# Altium footprint library Chestin_PcbLib.PcbLib: 203 footprints (part 13 of 13)
Each footprint in its own frame and in the unit in brackets; x right, y up, seen from the top. Pads: shape width x height; smd on the part's side, far side on the other; paste and mask are expansions set on the pad; w line width, h text height; cw(c..) or ccw(c..) is an arc to the next point about the centre after c.
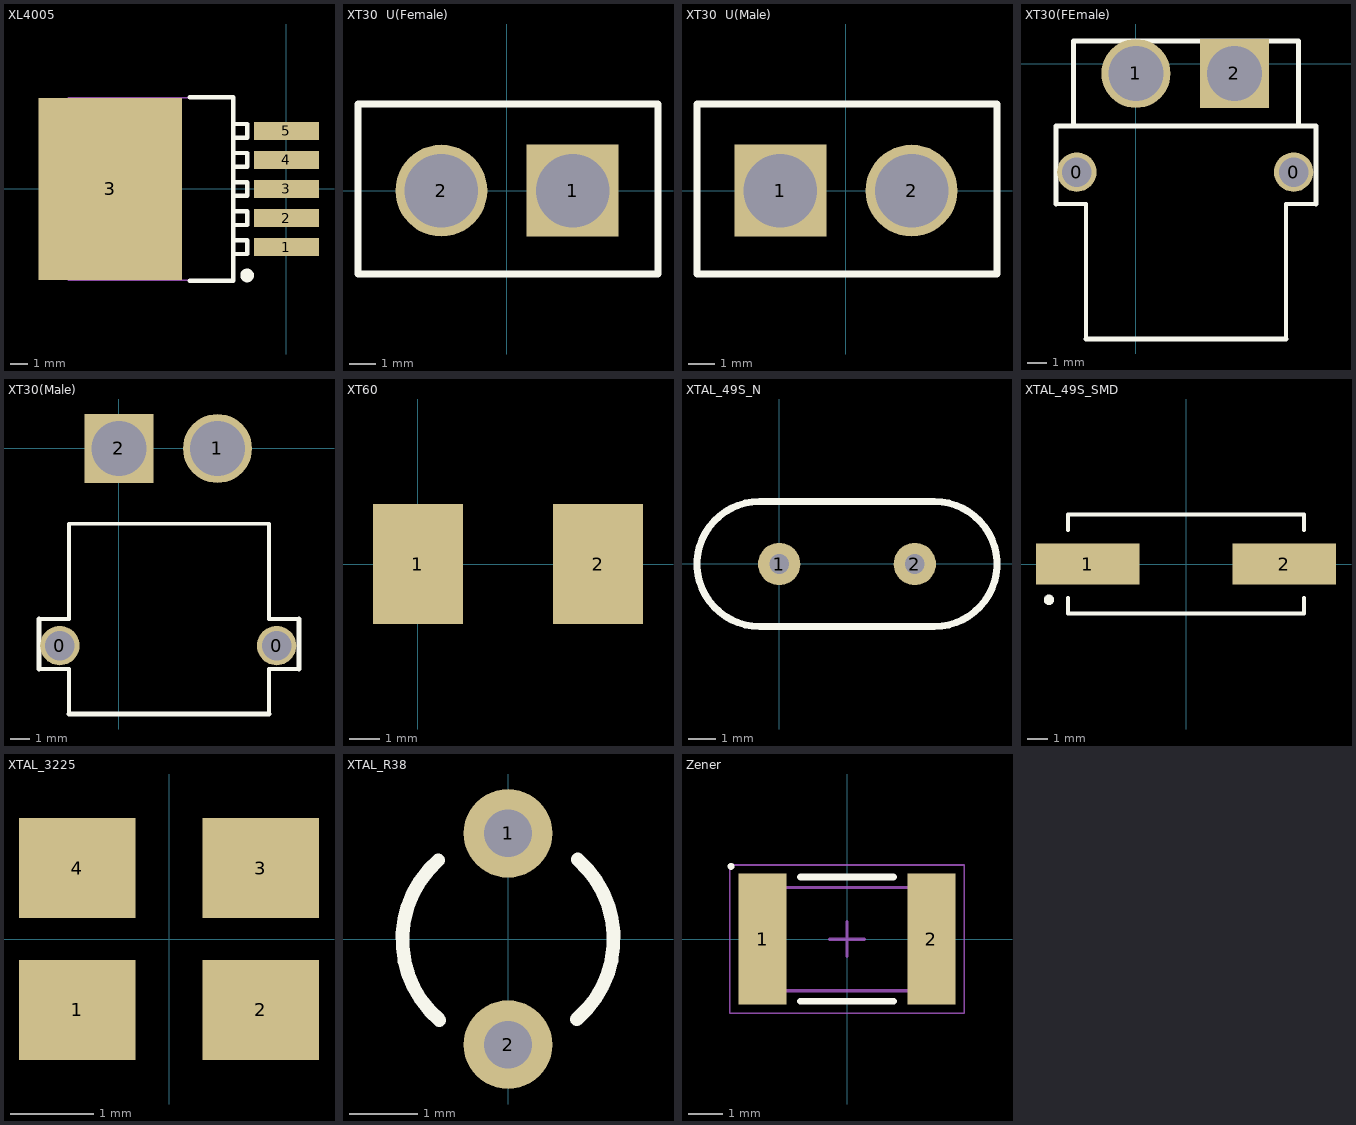
[diagram p12: the footprints below, top view; thin cyan lines are the x and y axes]

## XL4005 [mm]
pads (6):
  rect 3.8x1.05 smd: 1(0,-3.4) 2(0,-1.7) 3(0,0) 4(0,1.7) 5(0,3.4)
  rect 8.4x10.65 smd: 3(-10.3,0)
Top Overlay:
  circle w0.4: c-2.3,-5.05 r0.2
  lines w0.254: -5.65,-5.35 -3.1,-5.35 -3.1,5.35 -5.65,5.35 ; -3.1,-3 -2.3,-3 -2.3,-3.8 -3,-3.8 ; -3.1,-1.3 -2.3,-1.3 -2.3,-2.1 -3,-2.1 ; -3.1,0.4 -2.3,0.4 -2.3,-0.4 -3,-0.4 ; -3.1,2.1 -2.3,2.1 -2.3,1.3 -3,1.3 ; -3.1,3.8 -2.3,3.8 -2.3,3 -3,3
Mechanical 13:
  lines w0.1: -12.75,-5.325 -12.75,5.325 -3.1,5.325 -3.1,-5.325 -12.75,-5.325

## XT30  U(Female) [mm] "XT30母头"
height 5
pads (2):
  rect 3.5x3.5 hole 2.8: 1(2.5,0)
  round 3.5 hole 2.8: 2(-2.5,0)
Top Overlay:
  lines w0.254: -5.675,-3.175 5.755,-3.175 5.755,3.302 -5.675,3.302 -5.675,-3.175
3D body "User Library-XT30.STEP": height 12.6, standoff -2.9, extent -5.2,-2.6 5.2,2.7

## XT30  U(Male) [mm] "XT30公头"
height 5
pads (2):
  rect 3.5x3.5 hole 2.8: 1(-2.5,0)
  round 3.5 hole 2.8: 2(2.5,0)
Top Overlay:
  lines w0.254: -5.675,-3.175 -5.675,3.302 5.755,3.302 5.755,-3.175 -5.675,-3.175
3D body "User Library-XT30.STEP": height 12.6, standoff -2.9, extent -5.2,-2.6 5.2,2.7

## XT30(FEmale) [mm] "XT30母头"
height 5
pads (4):
  round 2 hole 1.5: 0(-3,-5.5) 0(8,-5.5)
  round 3.5 hole 2.8: 1(0,-0.5)
  rect 3.5x3.5 hole 2.8: 2(5,-0.5)
Top Overlay:
  lines w0.2: -4.064,-7.112 -2.54,-7.112 -2.54,-13.97 ; 7.62,-13.97 7.62,-7.112 9.144,-7.112
  lines w0.254: -4.064,-7.112 -4.064,-3.175 -3.175,-3.175 ; -2.54,-13.97 7.62,-13.97 ; 9.144,-7.112 9.144,-3.175 8.255,-3.175 ; -3.175,-3.175 8.255,-3.175 ; -3.175,-3.175 -3.175,1.143 8.255,1.143 8.255,-3.175
3D body "User Library-XT30- curved.STEP": height 5, standoff -2.1, extent -4.11,-13.99 9.19,1.016

## XT30(Male) [mm] "XT30公头"
height 5
pads (4):
  round 2 hole 1.5: 0(-3,-10) 0(8,-10)
  round 3.5 hole 2.8: 1(5,0)
  rect 3.5x3.5 hole 2.8: 2(0,0)
Top Overlay:
  lines w0.2: -4.064,-11.184 -2.54,-11.184 -2.54,-13.47 ; -4.064,-8.644 -2.54,-8.644 -2.54,-3.818 7.62,-3.818 7.62,-8.644 9.144,-8.644 ; 7.62,-13.47 7.62,-11.184 9.144,-11.184
  lines w0.254: -4.064,-11.184 -4.064,-8.644 ; -2.54,-13.47 7.62,-13.47 ; 9.144,-11.184 9.144,-8.644
3D body "User Library-XT30- curved.STEP": height 5, standoff -2.1, extent -4.11,-13.49 9.19,1.516

## XT60 [mm]
pads (2):
  rect 3x4 smd: 1(0,0) 2(6,0)

## XTAL_49S_N [mil]
pads (2):
  round 60 hole 28: 1(0,0) 2(192,0)
Top Overlay:
  lines w10: -28,-88.5 cw(c-28,0) -28,88.5 220,88.5 cw(c220,0) 220,-88.5 -28,-88.5
3D body "hc-49s_n.stp": height 157.48, standoff -98.43, extent -116.14,-89.37 309.06,87.8

## XTAL_49S_SMD [mm]
pads (2):
  rect 5x2 smd: 1(-4.75,0) 2(4.75,0)
Top Overlay:
  circle w0.25: c-6.625,-1.73 r0.125
  lines w0.2: -5.7,-1.65 -5.7,-2.4 5.7,-2.4 5.7,-1.65 ; -5.7,1.65 -5.7,2.4 5.7,2.4 5.7,1.65
3D body "User Library-hc49_cystal.STEP": height 4, standoff 0, extent -6.7,-2.462 6.7,2.438

## XTAL_3225 [mm]
pads (4):
  rect 1.4x1.2 smd: 1(-1.1,-0.85) 2(1.1,-0.85) 3(1.1,0.85) 4(-1.1,0.85)
3D body "晶阵.STEP": height 0.7, standoff 0, extent -1.6,-1.25 1.6,1.25

## XTAL_R38 [mm] "Crystal, Thru-Hole; 2 Leads; Body 3.1 x 8.2 mm (Dia.xH)"
height 8.2
pads (2):
  round 1.3 hole 0.7: 1(0,1.55) 2(0,-1.55)
Top Overlay:
  lines w0.2: -1.022,1.155 ccw(c0,-0.01) -1.006,-1.189 ; 1.006,-1.179 ccw(c0,0) 1.022,1.165

## Zener [mm]
pads (2):
  rect 1.4x3.8 smd: 1(-2.45,0) 2(2.45,0)
Top Overlay:
  circle w0.1: c-3.362,2.112 r0.05
  lines w0.2: -1.35,-1.8 1.35,-1.8 ; -1.35,1.8 1.35,1.8
Mechanical 13:
  lines w0.1: -2.15,-1.5 2.15,-1.5 2.15,1.5 -2.15,1.5 -2.15,-1.5
Mechanical 15:
  lines w0.05: -3.4,-2.15 3.4,-2.15 3.4,2.15 -3.4,2.15 -3.4,-2.15
  lines w0.1: -0.5,0 0.5,0 ; 0,-0.5 0,0.5
3D body: height 0.6, standoff 0, extent 1.65,-1.5 2.15,1.5
3D body: height 0.6, standoff 0, extent -2.15,-1.5 -1.65,1.5
3D body: height 0.6, standoff 0, extent -1.65,-1.5 1.65,1.5